# Altium footprint library pcb.PcbLib: 397 footprints (part 19 of 25)
Each footprint in its own frame and in the unit in brackets; x right, y up, seen from the top. Pads: shape width x height; smd on the part's side, far side on the other; paste and mask are expansions set on the pad; w line width, h text height; cw(c..) or ccw(c..) is an arc to the next point about the centre after c.
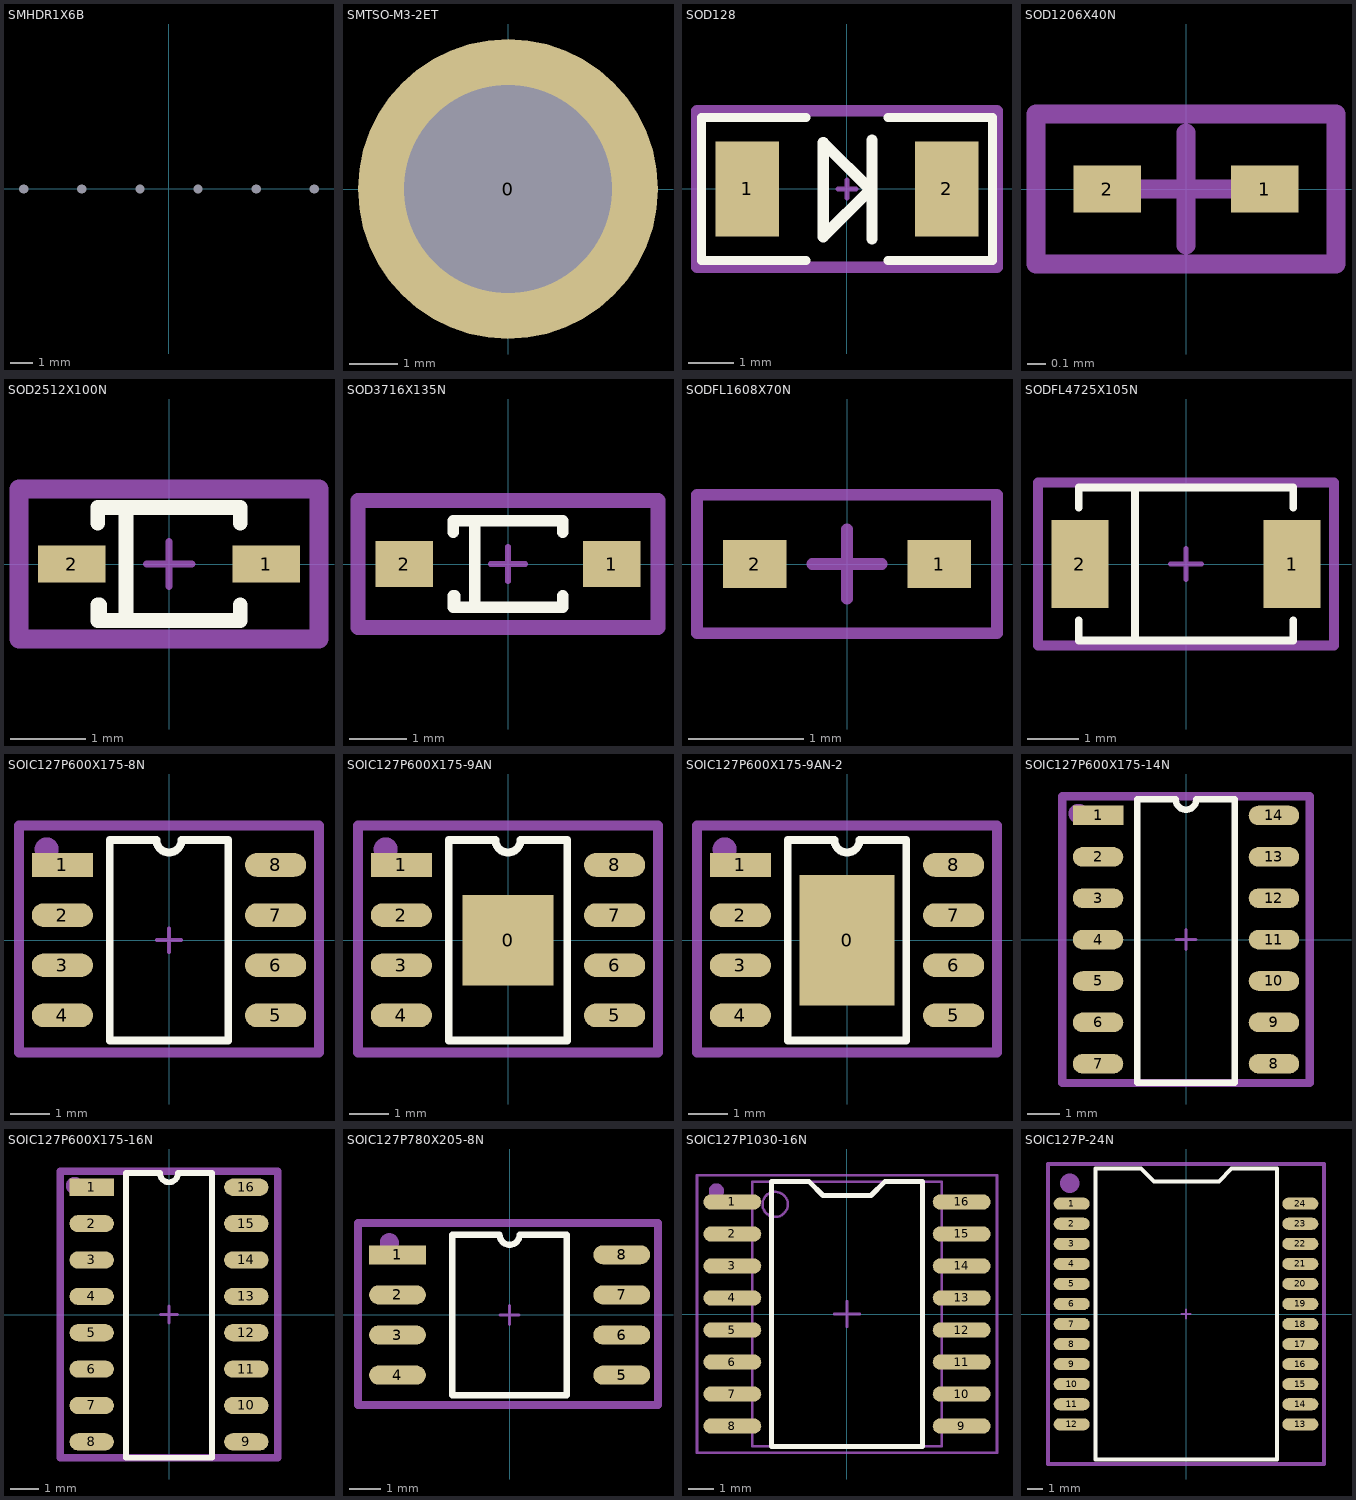
[diagram p18: the footprints below, top view; thin cyan lines are the x and y axes]

## SMHDR1X6B [mil] "Connector; Header; 6 Position"
pads (6):
  round 0 / inner round 0 / far side oval 70.87x98.43 hole 16: 1(-250,0) 2(-150,0) 3(-50,0) 4(50,0) 5(150,0) 6(250,0)
3D body: height 393.7, standoff 0, extent -334.65,-39.37 334.65,39.37

## SMTSO-M3-2ET [mm]
pads (1):
  round 6.2 / inner round 0 / far side round 0 hole 4.3 paste-25.4 mask+0: 0(0,0)
Top Paste:
  circle w0.4: c0,0 r2.6
3D body "SMTSO-M3-2ET-PennEngineering-08-13-2017.stp": height 2, standoff -1.53, extent -2.804,-2.774 2.756,2.786

## SOD128 [mm] "SOD128"
height 2.34
pads (2):
  rect 1.4x2.1 smd: 1(-2.2,0) 2(2.2,0)
Top Overlay:
  lines w0.2: -0.9,-1.575 -3.2,-1.575 -3.2,1.575 -0.9,1.575 ; 0.9,-1.575 3.2,-1.575 3.2,1.575 0.9,1.575
  lines w0.25: 0.525,0 -0.525,-1.05 -0.525,1.025 0.55,-0.05 ; 0.55,-1.1 0.55,1.075
Mechanical 15:
  lines w0.1: -0.2,0 0.2,0 ; 0,-0.2 0,0.2
  lines w0.254: -3.302,-1.727 3.302,-1.727 3.302,1.727 -3.302,1.727 -3.302,-1.727
  text "K" at 2.032,0.203 h1.02
  text "A" at -2.794,0.203 h1.02
  text ".Designator" at -3.454,-1.067 h1.02
3D body: height 1.1, standoff 0, extent -2,-1.4 2,1.4

## SOD1206X40N [mm] "SOD-923; 2 Leads; Body 0.8 x 0.4 mm, (LxW)"
height 0.4
pads (2):
  rect 0.36x0.25 smd: 1(0.42,0) 2(-0.42,0)
Mechanical 15:
  lines w0.1: -0.3,0 0.3,0 ; 0,-0.3 0,0.3 ; -0.8,-0.4 -0.8,0.4 0.8,0.4 0.8,-0.4 -0.8,-0.4
  text "K" at -0.8,0.6 h0.5
  text "A" at 0.5,0.6 h0.5
  text ".Designator" at -1.8,-0.9 h0.51
3D body: height 0.4, standoff 0, extent -0.4,-0.3 0.4,0.3

## SOD2512X100N [mm] "SOD-323/SC-76; 2 Leads; Body 1.7 x 1.3 mm, (LxW)"
height 1.1
pads (2):
  rect 0.9x0.5 smd: 1(1.3,0) 2(-1.3,0)
Top Overlay:
  lines w0.2: -0.95,-0.55 -0.95,-0.75 0.95,-0.75 0.95,-0.55 ; -0.95,0.55 -0.95,0.75 0.95,0.75 0.95,0.55 ; -0.925,-0.75 -0.925,-0.55 ; -0.575,-0.725 -0.575,0.725
Mechanical 15:
  lines w0.1: -0.3,0 0.3,0 ; 0,-0.3 0,0.3
  lines w0.254: -2,-1 -2,1 2,1 2,-1 -2,-1
  text "K" at -1.676,1.168 h1.02
  text "A" at 1.016,1.168 h1.02
  text ".Designator" at -1.75,-0.75 h0.51
3D body: height 1.5, standoff 0, extent -1.016,-0.889 1.016,0.889

## SOD3716X135N [mm] "SOD-123; SOD Diode;2.70mm W X 1.60mm L X 1.35mm H body"
height 1.1
pads (2):
  rect 1x0.8 smd: 1(1.8,0) 2(-1.8,0)
Top Overlay:
  lines w0.2: -0.95,-0.55 -0.95,-0.75 0.95,-0.75 0.95,-0.55 ; -0.95,0.55 -0.95,0.75 0.95,0.75 0.95,0.55 ; -0.925,-0.75 -0.925,-0.55 ; -0.575,-0.725 -0.575,0.725
Mechanical 15:
  lines w0.1: -0.3,0 0.3,0 ; 0,-0.3 0,0.3
  lines w0.254: -2.6,-1.1 2.6,-1.1 2.6,1.1 -2.6,1.1 -2.6,-1.1
  text ".Designator" at -2.3,-0.8 h0.51
  text "A" at 1.6,-0.2 h1.02
  text "K" at -2.2,-0.2 h1.02
3D body: height 1.5, standoff 0, extent -1.4,-0.9 1.4,0.9

## SODFL1608X70N [mm] "SOD-523"
height 0.7
pads (2):
  rect 0.55x0.42 smd: 1(0.8,0) 2(-0.8,0)
Mechanical 15:
  lines w0.1: -0.3,0 0.3,0 ; 0,-0.3 0,0.3 ; -1.3,-0.6 1.3,-0.6 1.3,0.6 -1.3,0.6 -1.3,-0.6
  text ".Designator" at -1.2,-1.3 h0.51
  text "A" at 0.7,0.8 h0.5
  text "K" at -1,0.8 h0.5
3D body: height 0.4, standoff 0, extent -0.7,-0.5 0.7,0.5

## SODFL4725X105N [mm] "SOD-128; SOD Diode;3.70mm W X 2.50mm L X 1.05mm H body"
height 1.05
pads (2):
  rect 1.12x1.72 smd: 1(2.08,0) 2(-2.08,0)
Top Overlay:
  lines w0.15: -2.1,-1.1 -2.1,-1.5 2.1,-1.5 2.1,-1.1 ; -2.1,1.1 -2.1,1.5 2.1,1.5 2.1,1.1 ; -1,-1.5 -1,1.5
Mechanical 15:
  lines w0.1: -0.3,0 0.3,0 ; 0,-0.3 0,0.3
  lines w0.2: -2.9,-1.6 2.9,-1.6 2.9,1.6 -2.9,1.6 -2.9,-1.6
  text ".Designator" at -2.5,-1.3 h0.51
  text "A" at 1.9,0.3 h1.02
  text "K" at -2.6,0.3 h1.02
3D body: height 1.5, standoff 0, extent -2,-1.4 2,1.4

## SOIC127P600X175-8N [mm]
height 1.75
pads (8):
  rect 1.55x0.6 smd: 1(-2.7,1.905)
  oval 1.55x0.6 smd: 2(-2.7,0.635) 3(-2.7,-0.635) 4(-2.7,-1.905) 5(2.7,-1.905) 6(2.7,-0.635) 7(2.7,0.635) 8(2.7,1.905)
Top Overlay:
  lines w0.2: -1.5,-2.54 -1.5,2.54 -0.318,2.54 ccw(c0,2.54) 0.318,2.54 1.5,2.54 1.5,-2.54 -1.5,-2.54
Mechanical 15:
  circle w0.406: c-3.1,2.3 r0.1
  lines w0.1: -0.3,0 0.3,0 ; 0,-0.3 0,0.3
  lines w0.254: -3.8,-2.845 3.8,-2.845 3.8,2.905 -3.8,2.905 -3.8,-2.845
  text ".Designator" at -2.9,-2.2 h1.02
3D body: height 1.75, standoff 0, extent -2,-2.5 2,2.5

## SOIC127P600X175-9AN [mm] "SOIC,1.27mm,pitch;8 pin,3.90mm W X 4.90mm L X 1.75mm H body (w/thermal tab)"
height 1.75
pads (9):
  rect 2.3x2.3 smd: 0(0,0)
  rect 1.55x0.6 smd: 1(-2.7,1.905)
  oval 1.55x0.6 smd: 2(-2.7,0.635) 3(-2.7,-0.635) 4(-2.7,-1.905) 5(2.7,-1.905) 6(2.7,-0.635) 7(2.7,0.635) 8(2.7,1.905)
Top Overlay:
  lines w0.2: -1.5,-2.54 1.5,-2.54 1.5,2.54 0.318,2.54 cw(c0,2.54) -0.318,2.54 -1.5,2.54 -1.5,-2.54
Mechanical 15:
  circle w0.406: c-3.1,2.3 r0.1
  lines w0.1: -0.3,0 0.3,0 ; 0,-0.3 0,0.3
  lines w0.254: -3.8,-2.845 -3.8,2.905 3.8,2.905 3.8,-2.845 -3.8,-2.845
  text ".Designator" at -2.9,-2.2 h1.02
3D body: height 1.75, standoff 0, extent -2,-2.5 2,2.5

## SOIC127P600X175-9AN-2 [mm] "SOIC,1.27mm,pitch;8 pin,3.90mm W X 4.90mm L X 1.75mm H body (w/thermal tab)"
height 1.75
pads (9):
  rect 2.4x3.3 smd: 0(0,0)
  rect 1.55x0.6 smd: 1(-2.7,1.905)
  oval 1.55x0.6 smd: 2(-2.7,0.635) 3(-2.7,-0.635) 4(-2.7,-1.905) 5(2.7,-1.905) 6(2.7,-0.635) 7(2.7,0.635) 8(2.7,1.905)
Top Overlay:
  lines w0.2: -1.5,-2.54 1.5,-2.54 1.5,2.54 0.318,2.54 cw(c0,2.54) -0.318,2.54 -1.5,2.54 -1.5,-2.54
Mechanical 15:
  circle w0.406: c-3.1,2.3 r0.1
  lines w0.1: -0.3,0 0.3,0 ; 0,-0.3 0,0.3
  lines w0.254: -3.8,-2.845 -3.8,2.905 3.8,2.905 3.8,-2.845 -3.8,-2.845
  text ".Designator" at -2.9,-2.2 h1.02
3D body: height 1.75, standoff 0, extent -2,-2.5 2,2.5

## SOIC127P600X175-14N [mm] "SOIC,1.27mm,pitch;14 pin,3.90mm W X ??mm L X 1.75mm H body"
pads (14):
  rect 1.55x0.6 smd: 1(-2.7,3.81)
  oval 1.55x0.6 smd: 2(-2.7,2.54) 3(-2.7,1.27) 4(-2.7,0) 5(-2.7,-1.27) 6(-2.7,-2.54) 7(-2.7,-3.81) 8(2.7,-3.81) 9(2.7,-2.54) 10(2.7,-1.27) 11(2.7,0) 12(2.7,1.27) 13(2.7,2.54) 14(2.7,3.81)
Top Overlay:
  lines w0.2: -1.5,-4.4 1.5,-4.4 1.5,4.305 0.318,4.305 cw(c0,4.305) -0.318,4.305 -1.5,4.305 -1.5,-4.4
Mechanical 15:
  circle w0.406: c-3.3,3.865 r0.1
  lines w0.1: -0.3,0 0.3,0 ; 0,-0.3 0,0.3
  lines w0.254: -3.8,-4.4 3.8,-4.4 3.8,4.4 -3.8,4.4 -3.8,-4.4
  text ".Designator" at -3.1,-3.4 h1.02
3D body: height 1.75, standoff 0, extent -2,-4.4 2,4.4

## SOIC127P600X175-16N [mm] "SOIC,1.27mm,pitch;16 pin,3.90mm W X 9.90mm L X 1.75mm H body"
pads (16):
  rect 1.55x0.6 smd: 1(-2.7,4.445)
  oval 1.55x0.6 smd: 2(-2.7,3.175) 3(-2.7,1.905) 4(-2.7,0.635) 5(-2.7,-0.635) 6(-2.7,-1.905) 7(-2.7,-3.175) 8(-2.7,-4.445) 9(2.7,-4.445) 10(2.7,-3.175) 11(2.7,-1.905) 12(2.7,-0.635) 13(2.7,0.635) 14(2.7,1.905) 15(2.7,3.175) 16(2.7,4.445)
Top Overlay:
  lines w0.2: -1.5,-5 -1.5,4.94 -0.318,4.94 ccw(c0,4.94) 0.318,4.94 1.5,4.94 1.5,-5 -1.5,-5
Mechanical 15:
  circle w0.406: c-3.3,4.5 r0.1
  lines w0.1: -0.3,0 0.3,0 ; 0,-0.3 0,0.3
  lines w0.254: -3.8,-5 -3.8,5 3.8,5 3.8,-5 -3.8,-5
  text ".Designator" at -3.2,-4.5 h1.02
3D body: height 1.75, standoff 0, extent -2,-5 2,5

## SOIC127P780X205-8N [mm]
height 2.38
pads (8):
  rect 1.8x0.6 smd: 1(-3.55,1.905)
  oval 1.8x0.6 smd: 2(-3.55,0.635) 3(-3.55,-0.635) 4(-3.55,-1.905) 5(3.55,-1.905) 6(3.55,-0.635) 7(3.55,0.635) 8(3.55,1.905)
Top Overlay:
  lines w0.2: -1.815,-2.54 1.815,-2.54 1.815,2.54 0.318,2.54 cw(c0,2.54) -0.318,2.54 -1.815,2.54 -1.815,-2.54
Mechanical 15:
  circle w0.406: c-3.808,2.286 r0.1
  lines w0.1: -0.3,0 0.3,0 ; 0,-0.3 0,0.3
  lines w0.254: -4.8,-2.845 -4.8,2.905 4.7,2.905 4.7,-2.845 -4.8,-2.845
  text ".Designator" at -1.3,1.155 h1.02
3D body: height 1.6, standoff 0, extent -2.45,-2.495 2.45,2.455

## SOIC127P1030-16N [mm] "SOIC, 16-Leads, Body 10.3x7.5mm, Pitch 1.27mm, IPC Medium Density"
height 2.65
pads (16):
  oval 2.3x0.6 smd: 1(-4.55,4.445) 2(-4.55,3.175) 3(-4.55,1.905) 4(-4.55,0.635) 5(-4.55,-0.635) 6(-4.55,-1.905) 7(-4.55,-3.175) 8(-4.55,-4.445) 9(4.55,-4.445) 10(4.55,-3.175) 11(4.55,-1.905) 12(4.55,-0.635) 13(4.55,0.635) 14(4.55,1.905) 15(4.55,3.175) 16(4.55,4.445)
Top Overlay:
  lines w0.2: -3,-5.25 -3,5.25 -1.5,5.25 -0.949,4.699 0.949,4.699 1.5,5.25 3,5.25 3,-5.25 -3,-5.25
Mechanical 13:
  circle w0.1: c-2.85,4.35 r0.5
  lines w0.1: -3.75,-5.25 -3.75,5.25 -1.875,5.25 1.875,5.25 3.75,5.25 3.75,-5.25 -3.75,-5.25
Mechanical 15:
  circle w0.406: c-5.18,4.877 r0.1
  lines w0.1: -0.5,0 0.5,0 ; 0,-0.5 0,0.5 ; -5.95,-5.5 -5.95,5.5 5.95,5.5 5.95,-5.5 -5.95,-5.5
  text ".Designator" at -2.164,1.206 h1.02
3D body: height 2.65, standoff 0, extent -3.75,-5.25 3.75,5.25

## SOIC127P-24N [mil]
height 244.09
pads (24):
  oval 90x30 smd: 1(-285,275) 2(-285,225) 3(-285,175) 4(-285,125) 5(-285,75) 6(-285,25) 7(-285,-25) 8(-285,-75) 9(-285,-125) 10(-285,-175) 11(-285,-225) 12(-285,-275) 13(285,-275) 14(285,-225) 15(285,-175) 16(285,-125) 17(285,-75) 18(285,-25) 19(285,25) 20(285,75) 21(285,125) 22(285,175) 23(285,225) 24(285,275)
Top Overlay:
  lines w10: -225.94,362.2 -225.94,-362.2 226.81,-362.2 226.81,362.2 114.01,362.2 82.51,330.71 -80.11,330.71 -111.6,362.2 -224.41,362.2
Mechanical 15:
  circle w40: c-289.94,326 r3.94
  lines w3.94: -11.81,0 11.81,0 ; 0,-11.81 0,11.81
  lines w10: -344.49,-374.02 -344.49,374.02 344.49,374.02 344.49,-374.02 -344.49,-374.02
  text ".Designator" at -206.69,305.12 h40
3D body: height 236.22, standoff 0, extent -240.16,-362.2 240.16,362.2